# Altium footprint library 22-Transformer.PcbLib: 68 footprints (part 1 of 5)
Each footprint in its own frame and in the unit in brackets; x right, y up, seen from the top. Pads: shape width x height; smd on the part's side, far side on the other; paste and mask are expansions set on the pad; w line width, h text height; cw(c..) or ccw(c..) is an arc to the next point about the centre after c.
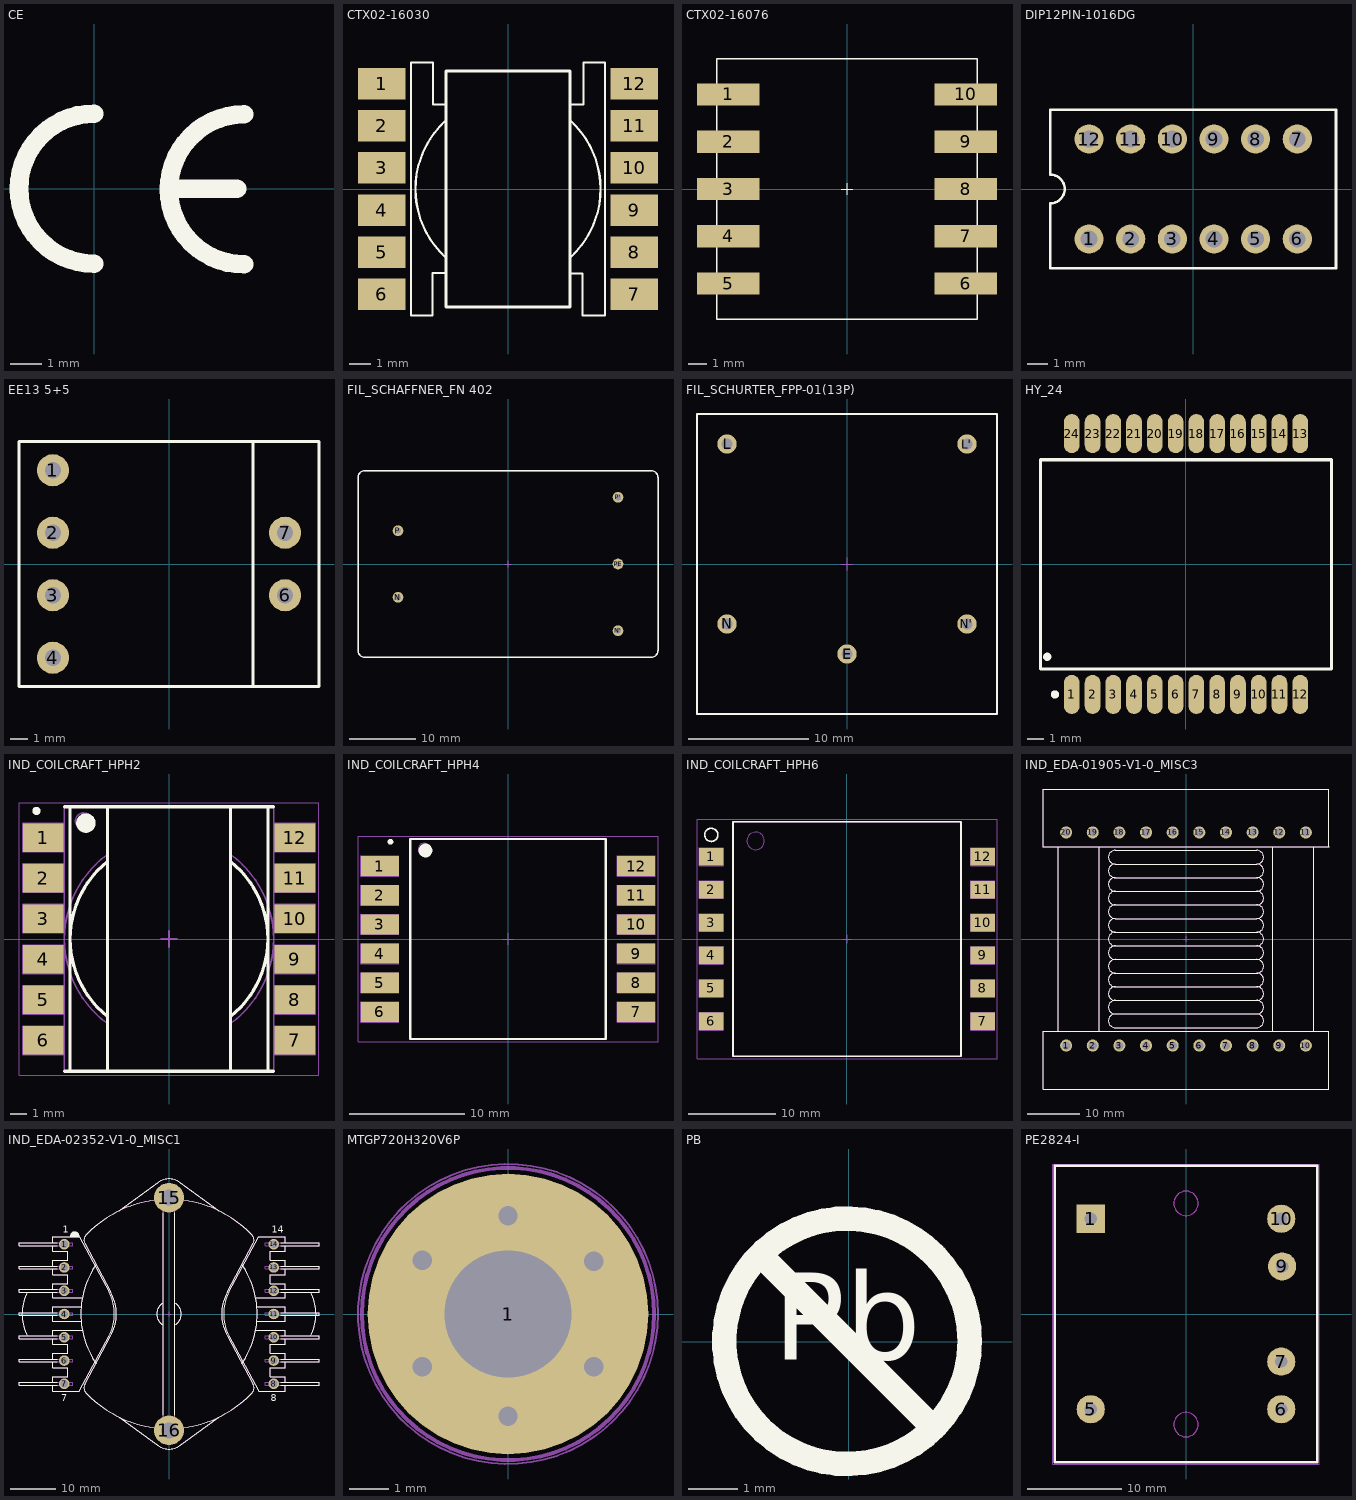
[diagram p0: the footprints below, top view; thin cyan lines are the x and y axes]

## CE [mm]
Top Overlay:
  lines w0.6: 0,-2.413 cw(c0,0) 0,2.413 ; 2.53,0 4.6,0 ; 4.826,-2.438 cw(c4.826,-0.025) 4.826,2.388
3D body "ce.stp": height 0.02, standoff 0, extent -2.725,-2.725 4.82,2.725

## CTX02-16030 [mm]
height 38.1
pads (12):
  rect 2.25x1.5 smd mask+0.07: 1(-6,5) 2(-6,3) 3(-6,1) 4(-6,-1) 5(-6,-3) 6(-6,-5) 7(6,-5) 8(6,-3) 9(6,-1) 10(6,1) 11(6,3)
  rect 2.25x1.5 smd: 12(6,5)
Top Overlay:
  lines w0.1: -4.6,5.994 -4.6,-6 -3.594,-6 ; -4.6,6 -3.569,6 -3.569,4.013 -2.972,4.013 ; -3.594,-5.982 -3.594,-3.995 -2.997,-3.995 ; -2.998,3.215 ccw(c0,0) -2.973,-3.238 ; 2.946,-4.013 3.543,-4.013 3.543,-6 4.6,-6 4.6,5.969 ; 2.973,3.238 cw(c0,0) 2.998,-3.215 ; 2.984,4.013 3.581,4.013 3.581,6 4.6,6
  lines w0.15: -2.95,-5.6 2.95,-5.6 2.95,5.6 -2.95,5.6 -2.95,-5.6

## CTX02-16076 [mm]
height 38.1
pads (10):
  rect 3.36x1.2 smd mask+0.07: 1(-6.38,5.08) 2(-6.38,2.54) 3(-6.38,0) 4(-6.38,-2.54) 5(-6.38,-5.08) 6(6.38,-5.08) 7(6.38,-2.54) 8(6.38,0) 9(6.38,2.54)
  rect 3.36x1.2 smd: 10(6.38,5.08)
Top Overlay:
  lines w0.025: -0.318,0 0.318,0 ; 0,-0.318 0,0.318
  lines w0.1: -7,-7 -7,7 7,7 7,-7 -7,-7
3D body "ctx-02-16076.stp": height 10.51, standoff 0, extent -7.739,-7.049 7.84,7.051
3D body "ctx02-16076.stp": height 0.02, standoff 0, extent 4.717,4.477 8.077,5.677
3D body "ctx02-16076.stp": height 0.02, standoff 0, extent 4.705,1.95 8.064,3.15
3D body "ctx02-16076.stp": height 0.02, standoff 0, extent 4.717,-0.616 8.077,0.584
3D body "ctx02-16076.stp": height 0.02, standoff 0, extent 4.705,-3.156 8.064,-1.956
3D body "ctx02-16076.stp": height 0.02, standoff 0, extent 4.705,-5.696 8.064,-4.496
3D body "ctx02-16076.stp": height 0.02, standoff 0, extent -8.077,4.49 -4.717,5.69
3D body "ctx02-16076.stp": height 0.02, standoff 0, extent -8.064,1.937 -4.705,3.137
3D body "ctx02-16076.stp": height 0.02, standoff 0, extent -8.064,-0.603 -4.705,0.597
3D body "ctx02-16076.stp": height 0.02, standoff 0, extent -8.064,-3.143 -4.705,-1.943
3D body "ctx02-16076.stp": height 0.02, standoff 0, extent -8.064,-5.683 -4.705,-4.483

## DIP12PIN-1016DG [mm]
height 38.1
pads (12):
  round 1.4 hole 0.8: 1(-5,-2.4) 2(-3,-2.4) 3(-1,-2.4) 4(1,-2.4) 5(3,-2.4) 6(5,-2.4) 7(5,2.4) 8(3,2.4) 9(1,2.4) 10(-1,2.4) 11(-3,2.4) 12(-5,2.4)
Top Overlay:
  lines w0.127: -6.858,-0.762 -6.858,-3.81 6.858,-3.81 6.858,3.81 -6.858,3.81 -6.858,0.688 cw(c-6.858,0) -6.858,-0.688
3D body "tf-1016dg.stp": height 5.86, standoff -2.35, extent -6.725,-3.7 6.725,3.7

## EE13 5+5 [mm]
height 38.1
pads (6):
  round 1.8 hole 0.9: 1(-6.5,5.25) 2(-6.5,1.75) 3(-6.5,-1.75) 4(-6.5,-5.25) 6(6.5,-1.75) 7(6.5,1.75)
Top Overlay:
  lines w0.15: 4.706,-6.858 4.706,6.858 ; -8.4,-6.858 8.4,-6.858 8.4,6.858 -8.4,6.858 -8.4,-6.858
3D body "ee13-4x4.stp": height 14, standoff -3.4, extent -8.4,-6.83 8.4,6.885

## FIL_SCHAFFNER_FN 402 [mm] "0.6 to 6.5A 250VAC Single Phase Low Cost PCB Filter (Body 45 x 28x 16.5mm)"
height 16.5
pads (5):
  round 1.6 hole 0.9: N(-16.5,-5) N'(16.5,-10) P(-16.5,5) P'(16.5,10) PE(16.5,0)
Top Overlay:
  lines w0.2: -22.5,-13 ccw(c-21.5,-13) -21.5,-14 21.5,-14 ccw(c21.5,-13) 22.5,-13 22.5,13 ccw(c21.5,13) 21.5,14 -21.5,14 ccw(c-21.5,13) -22.5,13 -22.5,-13
Mechanical 8:
  lines w0.1: -17,-5 -16.5,-5 ; -17,5 -16.5,5 ; -16.5,-5.5 -16.5,-5 ; -16.5,-4.5 -16.5,-5 ; -16.5,4.5 -16.5,5 ; -16.5,5.5 -16.5,5 ; -16,-5 -16.5,-5 ; -16,5 -16.5,5 ; -0.5,0 0,0 ; 0,-0.5 0,0 ; 0,0.5 0,0 ; 0.5,0 0,0 ; 16,-10 16.5,-10 ; 16,0 16.5,0 ; 16,10 16.5,10 ; 16.5,-10.5 16.5,-10 ; 16.5,-9.5 16.5,-10 ; 16.5,-0.5 16.5,0 ; 16.5,0.5 16.5,0 ; 16.5,9.5 16.5,10 ; 16.5,10.5 16.5,10 ; 17,-10 16.5,-10 ; 17,0 16.5,0 ; 17,10 16.5,10
Mechanical 14:
  lines w0.1: -20.5,14 -21.5,14 ; -21.5,14 ccw(c-21.5,13) -22.5,13 -22.5,-13 ccw(c-21.5,-13) -21.5,-14 21.5,-14 ccw(c21.5,-13) 22.5,-13 22.5,13 ccw(c21.5,13) 21.5,14 -21.5,14
3D body "FIL_SCHAFFNER_FN 402.stp": height 16.5, standoff -3.6, extent -22.5,-14 22.5,14

## FIL_SCHURTER_FPP-01(13P) [mm] "Single Phase Line Block Filter FPP-01 Serie, Case 13P"
height 25
pads (5):
  round 1.6 hole 0.9: E(0,-7.5) L(-10,10) L'(10,10) N(-10,-5) N'(10,-5)
Top Overlay:
  lines w0.2: -12.5,-12.5 -12.5,12.5 12.5,12.5 12.5,-12.5 -12.5,-12.5
Mechanical 8:
  lines w0.1: -10.5,-5 -10,-5 ; -10.5,10 -10,10 ; -10,-5.5 -10,-5 ; -10,-4.5 -10,-5 ; -10,9.5 -10,10 ; -10,10.5 -10,10 ; -9.5,-5 -10,-5 ; -9.5,10 -10,10 ; -0.5,-7.5 0,-7.5 ; -0.5,0 0,0 ; 0,-8 0,-7.5 ; 0,-7 0,-7.5 ; 0,-0.5 0,0 ; 0,0.5 0,0 ; 0.5,-7.5 0,-7.5 ; 0.5,0 0,0 ; 9.5,-5 10,-5 ; 9.5,10 10,10 ; 10,-5.5 10,-5 ; 10,-4.5 10,-5 ; 10,9.5 10,10 ; 10,10.5 10,10 ; 10.5,-5 10,-5 ; 10.5,10 10,10
Mechanical 14:
  lines w0.1: -12.5,-12.5 -12.5,12.5 12.5,12.5 12.5,-12.5 -12.5,-12.5
3D body "IND_SCHURTER_CASE 13P.stp": height 25, standoff -3.8, extent -12.5,-12.5 12.5,12.5

## HY_24 [mm]
height 38.1
pads (24):
  oval 0.96x2.4 smd mask+0.07: 1(-6.985,-7.975) 3(-4.445,-7.975) 4(-3.175,-7.975) 5(-1.905,-7.975) 6(-0.635,-7.975) 7(0.635,-7.975) 8(1.905,-7.975) 9(3.175,-7.975) 10(4.445,-7.975) 11(5.715,-7.975) 12(6.985,-7.975) 13(6.985,7.975) 14(5.715,7.975) 15(4.445,7.975) 16(3.175,7.975) 17(1.905,7.975) 18(0.635,7.975) 19(-0.635,7.975) 20(-1.905,7.975) 21(-3.175,7.975) 22(-4.445,7.975) 23(-5.715,7.975) 24(-6.985,7.975)
  oval 0.96x2.4 smd: 2(-5.715,-7.975)
Top Overlay:
  circle w0.25: c-8.49,-5.675 r0.125
  circle w0.25: c-8.015,-7.975 r0.125
  lines w0.2: -8.9,-6.425 8.9,-6.425 8.9,6.375 -8.9,6.375 -8.9,-6.425
3D body "0_95-2_44.stp": height 0.02, standoff 0, extent 6.505,-9.175 7.465,-6.775
3D body "0_95-2_44.stp": height 0.02, standoff 0, extent 5.235,-9.175 6.195,-6.775
3D body "0_95-2_44.stp": height 0.02, standoff 0, extent 3.965,-9.175 4.925,-6.775
3D body "0_95-2_44.stp": height 0.02, standoff 0, extent 2.695,-9.175 3.655,-6.775
3D body "0_95-2_44.stp": height 0.02, standoff 0, extent 1.425,-9.175 2.385,-6.775
3D body "0_95-2_44.stp": height 0.02, standoff 0, extent 0.155,-9.175 1.115,-6.775
3D body "0_95-2_44.stp": height 0.02, standoff 0, extent -1.115,-9.175 -0.155,-6.775
3D body "0_95-2_44.stp": height 0.02, standoff 0, extent -2.385,-9.175 -1.425,-6.775
3D body "0_95-2_44.stp": height 0.02, standoff 0, extent -3.655,-9.175 -2.695,-6.775
3D body "0_95-2_44.stp": height 0.02, standoff 0, extent -4.925,-9.175 -3.965,-6.775
3D body "0_95-2_44.stp": height 0.02, standoff 0, extent -6.195,-9.175 -5.235,-6.775
3D body "0_95-2_44.stp": height 0.02, standoff 0, extent -7.465,-9.175 -6.505,-6.775
3D body "0_95-2_44.stp": height 0.02, standoff 0, extent 6.505,6.775 7.465,9.175
3D body "0_95-2_44.stp": height 0.02, standoff 0, extent 5.235,6.775 6.195,9.175
3D body "0_95-2_44.stp": height 0.02, standoff 0, extent 3.965,6.775 4.925,9.175
3D body "0_95-2_44.stp": height 0.02, standoff 0, extent 2.695,6.775 3.655,9.175
3D body "0_95-2_44.stp": height 0.02, standoff 0, extent 1.425,6.775 2.385,9.175
3D body "0_95-2_44.stp": height 0.02, standoff 0, extent 0.155,6.775 1.115,9.175
3D body "0_95-2_44.stp": height 0.02, standoff 0, extent -1.115,6.775 -0.155,9.175
3D body "0_95-2_44.stp": height 0.02, standoff 0, extent -2.385,6.775 -1.425,9.175
3D body "0_95-2_44.stp": height 0.02, standoff 0, extent -3.655,6.775 -2.695,9.175
3D body "0_95-2_44.stp": height 0.02, standoff 0, extent -4.925,6.775 -3.965,9.175
3D body "0_95-2_44.stp": height 0.02, standoff 0, extent -6.195,6.775 -5.235,9.175
3D body "0_95-2_44.stp": height 0.02, standoff 0, extent -7.465,6.775 -6.505,9.175
3D body "hy682405.stp": height 3.25, standoff 0, extent -8.9,-7.92 8.9,7.92

## IND_COILCRAFT_HPH2 [mm] "Hexa-Path Magnetics, Six 1:1 Isolated Windings, HPH2 Case"
height 7.4
pads (12):
  rect 2.5x1.75 smd: 1(-7.75,6.25) 2(-7.75,3.75) 3(-7.75,1.25) 4(-7.75,-1.25) 5(-7.75,-3.75) 6(-7.75,-6.25) 7(7.75,-6.25) 8(7.75,-3.75) 9(7.75,-1.25) 10(7.75,1.25) 11(7.75,3.75) 12(7.75,6.25)
Top Overlay:
  circle w0.6: c-5.125,7.15 r0.3
  circle w0.25: c-8.175,7.9 r0.125
  lines w0.2: -6.45,-8.15 6.45,-8.15 ; -6.45,8.15 6.45,8.15 ; -6.1,-8.15 -6.1,8.15 ; -3.8,-8.15 -3.8,8.15 ; -3.8,-4.772 cw(c0,0) -3.8,4.772 ; 3.8,-8.15 3.8,8.15 ; 3.8,-4.772 ccw(c0,0) 3.8,4.772 ; 6.1,-8.15 6.1,8.15
Mechanical 8:
  lines w0.1: -8.25,-6.25 -7.75,-6.25 ; -8.25,-3.75 -7.75,-3.75 ; -8.25,-1.25 -7.75,-1.25 ; -8.25,1.25 -7.75,1.25 ; -8.25,3.75 -7.75,3.75 ; -8.25,6.25 -7.75,6.25 ; -7.75,-6.75 -7.75,-6.25 ; -7.75,-5.75 -7.75,-6.25 ; -7.75,-4.25 -7.75,-3.75 ; -7.75,-3.25 -7.75,-3.75 ; -7.75,-1.75 -7.75,-1.25 ; -7.75,-0.75 -7.75,-1.25 ; -7.75,0.75 -7.75,1.25 ; -7.75,1.75 -7.75,1.25 ; -7.75,3.25 -7.75,3.75 ; -7.75,4.25 -7.75,3.75 ; -7.75,5.75 -7.75,6.25 ; -7.75,6.75 -7.75,6.25 ; -7.25,-6.25 -7.75,-6.25 ; -7.25,-3.75 -7.75,-3.75 ; -7.25,-1.25 -7.75,-1.25 ; -7.25,1.25 -7.75,1.25 ; -7.25,3.75 -7.75,3.75 ; -7.25,6.25 -7.75,6.25 ; -0.5,0 0,0 ; 0,-0.5 0,0 ; 0,0.5 0,0 ; 0.5,0 0,0 ; 7.25,-6.25 7.75,-6.25 ; 7.25,-3.75 7.75,-3.75 ; 7.25,-1.25 7.75,-1.25 ; 7.25,1.25 7.75,1.25 ; 7.25,3.75 7.75,3.75 ; 7.25,6.25 7.75,6.25 ; 7.75,-6.75 7.75,-6.25 ; 7.75,-5.75 7.75,-6.25 ; 7.75,-4.25 7.75,-3.75 ; 7.75,-3.25 7.75,-3.75 ; 7.75,-1.75 7.75,-1.25 ; 7.75,-0.75 7.75,-1.25 ; 7.75,0.75 7.75,1.25 ; 7.75,1.75 7.75,1.25 ; 7.75,3.25 7.75,3.75 ; 7.75,4.25 7.75,3.75 ; 7.75,5.75 7.75,6.25 ; 7.75,6.75 7.75,6.25 ; 8.25,-6.25 7.75,-6.25 ; 8.25,-3.75 7.75,-3.75 ; 8.25,-1.25 7.75,-1.25 ; 8.25,1.25 7.75,1.25 ; 8.25,3.75 7.75,3.75 ; 8.25,6.25 7.75,6.25 ; -9,-7.125 -6.5,-7.125 -6.5,-5.375 -9,-5.375 -9,-7.125 ; -9,-4.625 -6.5,-4.625 -6.5,-2.875 -9,-2.875 -9,-4.625 ; -9,-2.125 -6.5,-2.125 -6.5,-0.375 -9,-0.375 -9,-2.125 ; -9,0.375 -6.5,0.375 -6.5,2.125 -9,2.125 -9,0.375 ; -9,2.875 -6.5,2.875 -6.5,4.625 -9,4.625 -9,2.875 ; -9,5.375 -6.5,5.375 -6.5,7.125 -9,7.125 -9,5.375 ; 6.5,-7.125 9,-7.125 9,-5.375 6.5,-5.375 6.5,-7.125 ; 6.5,-4.625 9,-4.625 9,-2.875 6.5,-2.875 6.5,-4.625 ; 6.5,-2.125 9,-2.125 9,-0.375 6.5,-0.375 6.5,-2.125 ; 6.5,0.375 9,0.375 9,2.125 6.5,2.125 6.5,0.375 ; 6.5,2.875 9,2.875 9,4.625 6.5,4.625 6.5,2.875 ; 6.5,5.375 9,5.375 9,7.125 6.5,7.125 6.5,5.375
Mechanical 14:
  circle w0.1: c-5.275,7.275 r0.5
  lines w0.1: -3.8,-8.15 -3.8,8.15 ; -3.8,-5.212 cw(c0,0) -3.8,5.212 ; 3.8,-8.15 3.8,8.15 ; 3.8,-5.212 ccw(c0,0) 3.8,5.212 ; -6.45,-8.15 -6.45,8.15 6.45,8.15 6.45,-8.15 -6.45,-8.15
Mechanical 15:
  lines w0.05: -9.25,-8.4 -9.25,8.4 9.25,8.4 9.25,-8.4 -9.25,-8.4
3D body "IND_COILCRAFT_HPH2.stp": height 7.4, standoff 0.01, extent -8.4,-8.15 8.4,8.15

## IND_COILCRAFT_HPH4 [mm] "Hexa-Path Magnetics, Two Trifilar Windings, HPH4 Case"
height 9.7
pads (12):
  rect 3.3x1.75 smd: 1(-11.15,6.35) 2(-11.15,3.81) 3(-11.15,1.27) 4(-11.15,-1.27) 5(-11.15,-3.81) 6(-11.15,-6.35) 7(11.15,-6.35) 8(11.15,-3.81) 9(11.15,-1.27) 10(11.15,1.27) 11(11.15,3.81) 12(11.15,6.35)
Top Overlay:
  circle w0.25: c-10.225,8.45 r0.125
  circle w0.6: c-7.175,7.7 r0.3
  lines w0.2: -8.5,-8.7 8.5,-8.7 8.5,8.7 -8.5,8.7 -8.5,-8.7
Mechanical 8:
  lines w0.1: -11.65,-6.35 -11.15,-6.35 ; -11.65,-3.81 -11.15,-3.81 ; -11.65,-1.27 -11.15,-1.27 ; -11.65,1.27 -11.15,1.27 ; -11.65,3.81 -11.15,3.81 ; -11.65,6.35 -11.15,6.35 ; -11.15,-6.85 -11.15,-6.35 ; -11.15,-5.85 -11.15,-6.35 ; -11.15,-4.31 -11.15,-3.81 ; -11.15,-3.31 -11.15,-3.81 ; -11.15,-1.77 -11.15,-1.27 ; -11.15,-0.77 -11.15,-1.27 ; -11.15,0.77 -11.15,1.27 ; -11.15,1.77 -11.15,1.27 ; -11.15,3.31 -11.15,3.81 ; -11.15,4.31 -11.15,3.81 ; -11.15,5.85 -11.15,6.35 ; -11.15,6.85 -11.15,6.35 ; -10.65,-6.35 -11.15,-6.35 ; -10.65,-3.81 -11.15,-3.81 ; -10.65,-1.27 -11.15,-1.27 ; -10.65,1.27 -11.15,1.27 ; -10.65,3.81 -11.15,3.81 ; -10.65,6.35 -11.15,6.35 ; -0.5,0 0,0 ; 0,-0.5 0,0 ; 0,0.5 0,0 ; 0.5,0 0,0 ; 10.65,-6.35 11.15,-6.35 ; 10.65,-3.81 11.15,-3.81 ; 10.65,-1.27 11.15,-1.27 ; 10.65,1.27 11.15,1.27 ; 10.65,3.81 11.15,3.81 ; 10.65,6.35 11.15,6.35 ; 11.15,-6.85 11.15,-6.35 ; 11.15,-5.85 11.15,-6.35 ; 11.15,-4.31 11.15,-3.81 ; 11.15,-3.31 11.15,-3.81 ; 11.15,-1.77 11.15,-1.27 ; 11.15,-0.77 11.15,-1.27 ; 11.15,0.77 11.15,1.27 ; 11.15,1.77 11.15,1.27 ; 11.15,3.31 11.15,3.81 ; 11.15,4.31 11.15,3.81 ; 11.15,5.85 11.15,6.35 ; 11.15,6.85 11.15,6.35 ; 11.65,-6.35 11.15,-6.35 ; 11.65,-3.81 11.15,-3.81 ; 11.65,-1.27 11.15,-1.27 ; 11.65,1.27 11.15,1.27 ; 11.65,3.81 11.15,3.81 ; 11.65,6.35 11.15,6.35 ; -12.8,-7.225 -12.8,-5.475 -9.5,-5.475 -9.5,-7.225 -12.8,-7.225 ; -12.8,-4.685 -12.8,-2.935 -9.5,-2.935 -9.5,-4.685 -12.8,-4.685 ; -12.8,-2.145 -12.8,-0.395 -9.5,-0.395 -9.5,-2.145 -12.8,-2.145 ; -12.8,0.395 -12.8,2.145 -9.5,2.145 -9.5,0.395 -12.8,0.395 ; -12.8,2.935 -12.8,4.685 -9.5,4.685 -9.5,2.935 -12.8,2.935 ; -12.8,5.475 -12.8,7.225 -9.5,7.225 -9.5,5.475 -12.8,5.475 ; 9.5,-7.225 9.5,-5.475 12.8,-5.475 12.8,-7.225 9.5,-7.225 ; 9.5,-4.685 9.5,-2.935 12.8,-2.935 12.8,-4.685 9.5,-4.685 ; 9.5,-2.145 9.5,-0.395 12.8,-0.395 12.8,-2.145 9.5,-2.145 ; 9.5,0.395 9.5,2.145 12.8,2.145 12.8,0.395 9.5,0.395 ; 9.5,2.935 9.5,4.685 12.8,4.685 12.8,2.935 9.5,2.935 ; 9.5,5.475 9.5,7.225 12.8,7.225 12.8,5.475 9.5,5.475
Mechanical 14:
  circle w0.1: c-7.325,7.825 r0.5
  lines w0.1: -8.5,-8.7 8.5,-8.7 8.5,8.7 -8.5,8.7 -8.5,-8.7
Mechanical 15:
  lines w0.05: -13.05,-8.95 13.05,-8.95 13.05,8.95 -13.05,8.95 -13.05,-8.95
3D body "IND_COILCRAFT_HPH4.stp": height 9.7, standoff 0, extent -12.065,-8.7 12.065,8.7

## IND_COILCRAFT_HPH6 [mm] "Hexa-Path Magnetics, Two Trifilar Windings, HPH6 Case"
height 13.6
pads (12):
  rect 2.75x2 smd: 1(-15.475,9.375) 2(-15.475,5.625) 3(-15.475,1.875) 4(-15.475,-1.875) 5(-15.475,-5.625) 6(-15.475,-9.375) 7(15.475,-9.375) 8(15.475,-5.625) 9(15.475,-1.875) 10(15.475,1.875) 11(15.475,5.625) 12(15.475,9.375)
Top Overlay:
  circle w0.2: c-15.475,11.875 r0.75
  lines w0.2: -13,-13.375 -13,13.375 13,13.375 13,-13.375 -13,-13.375
Mechanical 8:
  lines w0.1: -15.975,-9.375 -15.475,-9.375 ; -15.975,-5.625 -15.475,-5.625 ; -15.975,-1.875 -15.475,-1.875 ; -15.975,1.875 -15.475,1.875 ; -15.975,5.625 -15.475,5.625 ; -15.975,9.375 -15.475,9.375 ; -15.475,-9.875 -15.475,-9.375 ; -15.475,-8.875 -15.475,-9.375 ; -15.475,-6.125 -15.475,-5.625 ; -15.475,-5.125 -15.475,-5.625 ; -15.475,-2.375 -15.475,-1.875 ; -15.475,-1.375 -15.475,-1.875 ; -15.475,1.375 -15.475,1.875 ; -15.475,2.375 -15.475,1.875 ; -15.475,5.125 -15.475,5.625 ; -15.475,6.125 -15.475,5.625 ; -15.475,8.875 -15.475,9.375 ; -15.475,9.875 -15.475,9.375 ; -14.975,-9.375 -15.475,-9.375 ; -14.975,-5.625 -15.475,-5.625 ; -14.975,-1.875 -15.475,-1.875 ; -14.975,1.875 -15.475,1.875 ; -14.975,5.625 -15.475,5.625 ; -14.975,9.375 -15.475,9.375 ; -0.5,0 0,0 ; 0,-0.5 0,0 ; 0,0.5 0,0 ; 0.5,0 0,0 ; 14.975,-9.375 15.475,-9.375 ; 14.975,-5.625 15.475,-5.625 ; 14.975,-1.875 15.475,-1.875 ; 14.975,1.875 15.475,1.875 ; 14.975,5.625 15.475,5.625 ; 14.975,9.375 15.475,9.375 ; 15.475,-9.875 15.475,-9.375 ; 15.475,-8.875 15.475,-9.375 ; 15.475,-6.125 15.475,-5.625 ; 15.475,-5.125 15.475,-5.625 ; 15.475,-2.375 15.475,-1.875 ; 15.475,-1.375 15.475,-1.875 ; 15.475,1.375 15.475,1.875 ; 15.475,2.375 15.475,1.875 ; 15.475,5.125 15.475,5.625 ; 15.475,6.125 15.475,5.625 ; 15.475,8.875 15.475,9.375 ; 15.475,9.875 15.475,9.375 ; 15.975,-9.375 15.475,-9.375 ; 15.975,-5.625 15.475,-5.625 ; 15.975,-1.875 15.475,-1.875 ; 15.975,1.875 15.475,1.875 ; 15.975,5.625 15.475,5.625 ; 15.975,9.375 15.475,9.375 ; -16.85,-10.375 -14.1,-10.375 -14.1,-8.375 -16.85,-8.375 -16.85,-10.375 ; -16.85,-6.625 -14.1,-6.625 -14.1,-4.625 -16.85,-4.625 -16.85,-6.625 ; -16.85,-2.875 -14.1,-2.875 -14.1,-0.875 -16.85,-0.875 -16.85,-2.875 ; -16.85,0.875 -14.1,0.875 -14.1,2.875 -16.85,2.875 -16.85,0.875 ; -16.85,4.625 -14.1,4.625 -14.1,6.625 -16.85,6.625 -16.85,4.625 ; -16.85,8.375 -14.1,8.375 -14.1,10.375 -16.85,10.375 -16.85,8.375 ; 14.1,-10.375 16.85,-10.375 16.85,-8.375 14.1,-8.375 14.1,-10.375 ; 14.1,-6.625 16.85,-6.625 16.85,-4.625 14.1,-4.625 14.1,-6.625 ; 14.1,-2.875 16.85,-2.875 16.85,-0.875 14.1,-0.875 14.1,-2.875 ; 14.1,0.875 16.85,0.875 16.85,2.875 14.1,2.875 14.1,0.875 ; 14.1,4.625 16.85,4.625 16.85,6.625 14.1,6.625 14.1,4.625 ; 14.1,8.375 16.85,8.375 16.85,10.375 14.1,10.375 14.1,8.375
Mechanical 14:
  circle w0.1: c-10.409,11.181 r1
  lines w0.1: -13,-13.375 -13,13.375 13,13.375 13,-13.375 -13,-13.375
Mechanical 15:
  lines w0.05: -17.1,-13.625 17.1,-13.625 17.1,13.625 -17.1,13.625 -17.1,-13.625
3D body "IND_COILCRAFT_HPH6.stp": height 13.6, standoff 0, extent -16.325,-13.375 16.325,13.375

## IND_EDA-01905-V1-0_MISC3 [mm] "see EDA-01905-V1-0_misc3"
height 40.6
pads (20):
  round 2.3 hole 1.6: 1(-22.86,-20.32) 2(-17.78,-20.32) 3(-12.7,-20.32) 4(-7.62,-20.32) 5(-2.54,-20.32) 6(2.54,-20.32) 7(7.62,-20.32) 8(12.7,-20.32) 9(17.78,-20.32) 10(22.86,-20.32) 11(22.86,20.32) 12(17.78,20.32) 13(12.7,20.32) 14(7.62,20.32) 15(2.54,20.32) 16(-2.54,20.32) 17(-7.62,20.32) 18(-12.7,20.32) 19(-17.78,20.32) 20(-22.86,20.32)
Top Overlay:
  lines w0.2: -27.35,17.6 27.35,17.6 ; -27.25,17.6 -27.25,28.6 27.25,28.6 27.25,17.6 ; -24.35,-17.6 -24.35,17.6 ; -16.583,-17.6 -16.583,17.6 ; 16.583,-17.6 16.583,17.6 ; 24.35,-17.6 24.35,17.6 ; -13.5,-14.3 cw(c-13.5,-13) -13.5,-11.7 ; -13.5,-14.3 ccw(c-13.5,-15.6) -13.5,-16.9 13.5,-16.9 ccw(c13.5,-15.6) 13.5,-14.3 ; -13.5,-14.3 13.5,-14.3 ; -13.5,-11.7 cw(c-13.5,-10.4) -13.5,-9.1 ; -13.5,-11.7 13.5,-11.7 ; -13.5,-9.1 cw(c-13.5,-7.8) -13.5,-6.5 ; -13.5,-9.1 13.5,-9.1 ; -13.5,-6.5 cw(c-13.5,-5.2) -13.5,-3.9 ; -13.5,-6.5 13.5,-6.5 ; -13.5,-3.9 cw(c-13.5,-2.6) -13.5,-1.3 ; -13.5,-3.9 13.5,-3.9 ; -13.5,-1.3 cw(c-13.5,0) -13.5,1.3 ; -13.5,-1.3 13.5,-1.3 ; -13.5,1.3 cw(c-13.5,2.6) -13.5,3.9 ; -13.5,1.3 13.5,1.3 ; -13.5,3.9 cw(c-13.5,5.2) -13.5,6.5 ; -13.5,3.9 13.5,3.9 ; -13.5,6.5 cw(c-13.5,7.8) -13.5,9.1 ; -13.5,6.5 13.5,6.5 ; -13.5,9.1 cw(c-13.5,10.4) -13.5,11.7 ; -13.5,9.1 13.5,9.1 ; -13.5,11.7 cw(c-13.5,13) -13.5,14.3 ; -13.5,11.7 13.5,11.7 ; -13.5,14.3 cw(c-13.5,15.6) -13.5,16.9 13.5,16.9 cw(c13.5,15.6) 13.5,14.3 ; -13.5,14.3 13.5,14.3 ; -13.5,14.3 13.5,14.3 ; 13.5,-14.3 ccw(c13.5,-13) 13.5,-11.7 ; 13.5,-11.7 ccw(c13.5,-10.4) 13.5,-9.1 ; 13.5,-9.1 ccw(c13.5,-7.8) 13.5,-6.5 ; 13.5,-6.5 ccw(c13.5,-5.2) 13.5,-3.9 ; 13.5,-3.9 ccw(c13.5,-2.6) 13.5,-1.3 ; 13.5,-1.3 ccw(c13.5,0) 13.5,1.3 ; 13.5,1.3 ccw(c13.5,2.6) 13.5,3.9 ; 13.5,3.9 ccw(c13.5,5.2) 13.5,6.5 ; 13.5,6.5 ccw(c13.5,7.8) 13.5,9.1 ; 13.5,9.1 ccw(c13.5,10.4) 13.5,11.7 ; 13.5,11.7 ccw(c13.5,13) 13.5,14.3 ; -27.25,-28.6 -27.25,-17.6 27.25,-17.6 27.25,-28.6 -27.25,-28.6
Mechanical 8:
  lines w0.1: -23.36,-20.32 -22.86,-20.32 ; -23.36,20.32 -22.86,20.32 ; -22.86,-20.82 -22.86,-20.32 ; -22.86,-19.82 -22.86,-20.32 ; -22.86,19.82 -22.86,20.32 ; -22.86,20.82 -22.86,20.32 ; -22.36,-20.32 -22.86,-20.32 ; -22.36,20.32 -22.86,20.32 ; -18.28,-20.32 -17.78,-20.32 ; -18.28,20.32 -17.78,20.32 ; -17.78,-20.82 -17.78,-20.32 ; -17.78,-19.82 -17.78,-20.32 ; -17.78,19.82 -17.78,20.32 ; -17.78,20.82 -17.78,20.32 ; -17.28,-20.32 -17.78,-20.32 ; -17.28,20.32 -17.78,20.32 ; -13.2,-20.32 -12.7,-20.32 ; -13.2,20.32 -12.7,20.32 ; -12.7,-20.82 -12.7,-20.32 ; -12.7,-19.82 -12.7,-20.32 ; -12.7,19.82 -12.7,20.32 ; -12.7,20.82 -12.7,20.32 ; -12.2,-20.32 -12.7,-20.32 ; -12.2,20.32 -12.7,20.32 ; -8.12,-20.32 -7.62,-20.32 ; -8.12,20.32 -7.62,20.32 ; -7.62,-20.82 -7.62,-20.32 ; -7.62,-19.82 -7.62,-20.32 ; -7.62,19.82 -7.62,20.32 ; -7.62,20.82 -7.62,20.32 ; -7.12,-20.32 -7.62,-20.32 ; -7.12,20.32 -7.62,20.32 ; -3.04,-20.32 -2.54,-20.32 ; -3.04,20.32 -2.54,20.32 ; -2.54,-20.82 -2.54,-20.32 ; -2.54,-19.82 -2.54,-20.32 ; -2.54,19.82 -2.54,20.32 ; -2.54,20.82 -2.54,20.32 ; -2.04,-20.32 -2.54,-20.32 ; -2.04,20.32 -2.54,20.32 ; -0.5,0 0,0 ; 0,-0.5 0,0 ; 0,0.5 0,0 ; 0.5,0 0,0 ; 2.04,-20.32 2.54,-20.32 ; 2.04,20.32 2.54,20.32 ; 2.54,-20.82 2.54,-20.32 ; 2.54,-19.82 2.54,-20.32 ; 2.54,19.82 2.54,20.32 ; 2.54,20.82 2.54,20.32 ; 3.04,-20.32 2.54,-20.32 ; 3.04,20.32 2.54,20.32 ; 7.12,-20.32 7.62,-20.32 ; 7.12,20.32 7.62,20.32 ; 7.62,-20.82 7.62,-20.32 ; 7.62,-19.82 7.62,-20.32 ; 7.62,19.82 7.62,20.32 ; 7.62,20.82 7.62,20.32 ; 8.12,-20.32 7.62,-20.32 ; 8.12,20.32 7.62,20.32 ; 12.2,-20.32 12.7,-20.32 ; 12.2,20.32 12.7,20.32 ; 12.7,-20.82 12.7,-20.32 ; 12.7,-19.82 12.7,-20.32 ; 12.7,19.82 12.7,20.32 ; 12.7,20.82 12.7,20.32 ; 13.2,-20.32 12.7,-20.32 ; 13.2,20.32 12.7,20.32 ; 17.28,-20.32 17.78,-20.32 ; 17.28,20.32 17.78,20.32 ; 17.78,-20.82 17.78,-20.32 ; 17.78,-19.82 17.78,-20.32 ; 17.78,19.82 17.78,20.32 ; 17.78,20.82 17.78,20.32 ; 18.28,-20.32 17.78,-20.32 ; 18.28,20.32 17.78,20.32 ; 22.36,-20.32 22.86,-20.32 ; 22.36,20.32 22.86,20.32 ; 22.86,-20.82 22.86,-20.32 ; 22.86,-19.82 22.86,-20.32 ; 22.86,19.82 22.86,20.32 ; 22.86,20.82 22.86,20.32 ; 23.36,-20.32 22.86,-20.32 ; 23.36,20.32 22.86,20.32
Mechanical 14:
  lines w0.1: -27.35,17.6 27.35,17.6 ; -27.25,17.6 -27.25,28.6 27.25,28.6 27.25,17.6 ; -24.35,-17.6 -24.35,17.6 ; -16.583,-17.6 -16.583,17.6 ; 16.583,-17.6 16.583,17.6 ; 24.35,-17.6 24.35,17.6 ; -13.5,-14.3 cw(c-13.5,-13) -13.5,-11.7 ; -13.5,-14.3 ccw(c-13.5,-15.6) -13.5,-16.9 13.5,-16.9 ccw(c13.5,-15.6) 13.5,-14.3 ; -13.5,-14.3 13.5,-14.3 ; -13.5,-11.7 cw(c-13.5,-10.4) -13.5,-9.1 ; -13.5,-11.7 13.5,-11.7 ; -13.5,-9.1 cw(c-13.5,-7.8) -13.5,-6.5 ; -13.5,-9.1 13.5,-9.1 ; -13.5,-6.5 cw(c-13.5,-5.2) -13.5,-3.9 ; -13.5,-6.5 13.5,-6.5 ; -13.5,-3.9 cw(c-13.5,-2.6) -13.5,-1.3 ; -13.5,-3.9 13.5,-3.9 ; -13.5,-1.3 cw(c-13.5,0) -13.5,1.3 ; -13.5,-1.3 13.5,-1.3 ; -13.5,1.3 cw(c-13.5,2.6) -13.5,3.9 ; -13.5,1.3 13.5,1.3 ; -13.5,3.9 cw(c-13.5,5.2) -13.5,6.5 ; -13.5,3.9 13.5,3.9 ; -13.5,6.5 cw(c-13.5,7.8) -13.5,9.1 ; -13.5,6.5 13.5,6.5 ; -13.5,9.1 cw(c-13.5,10.4) -13.5,11.7 ; -13.5,9.1 13.5,9.1 ; -13.5,11.7 cw(c-13.5,13) -13.5,14.3 ; -13.5,11.7 13.5,11.7 ; -13.5,14.3 cw(c-13.5,15.6) -13.5,16.9 13.5,16.9 cw(c13.5,15.6) 13.5,14.3 ; -13.5,14.3 13.5,14.3 ; -13.5,14.3 13.5,14.3 ; 13.5,-14.3 ccw(c13.5,-13) 13.5,-11.7 ; 13.5,-11.7 ccw(c13.5,-10.4) 13.5,-9.1 ; 13.5,-9.1 ccw(c13.5,-7.8) 13.5,-6.5 ; 13.5,-6.5 ccw(c13.5,-5.2) 13.5,-3.9 ; 13.5,-3.9 ccw(c13.5,-2.6) 13.5,-1.3 ; 13.5,-1.3 ccw(c13.5,0) 13.5,1.3 ; 13.5,1.3 ccw(c13.5,2.6) 13.5,3.9 ; 13.5,3.9 ccw(c13.5,5.2) 13.5,6.5 ; 13.5,6.5 ccw(c13.5,7.8) 13.5,9.1 ; 13.5,9.1 ccw(c13.5,10.4) 13.5,11.7 ; 13.5,11.7 ccw(c13.5,13) 13.5,14.3 ; -27.25,-28.6 -27.25,-17.6 27.25,-17.6 27.25,-28.6 -27.25,-28.6
3D body "EDA-01905-V1-0_misc3.stp": height 43.4, standoff -3.86, extent -27.35,-28.6 27.35,28.6

## IND_EDA-02352-V1-0_MISC1 [mm] "see EDA-02352-V1-0_misc1"
height 44.5
pads (16):
  round 2.3 hole 1.6: 1(-22.86,15.24) 2(-22.86,10.16) 3(-22.86,5.08) 4(-22.86,0) 5(-22.86,-5.08) 6(-22.86,-10.16) 7(-22.86,-15.24) 8(22.86,-15.24) 9(22.86,-10.16) 10(22.86,-5.08) 11(22.86,0) 12(22.86,5.08) 13(22.86,10.16) 14(22.86,15.24)
  round 6.5 hole 3.5: 15(0,25.4) 16(0,-25.4)
Top Overlay:
  lines w0.2: -30.902,-4.772 cw(c-22,0) -30.902,4.772 ; -25.4,-15.54 -25.4,-16.9 -19.6,-16.9 -13.098,-4.772 ccw(c-22,0) -13.098,4.772 -19.6,16.9 ; -25.4,-14.94 -25.4,-13.7 -22.1,-13.7 -22.1,-11.7 -25.4,-11.7 -25.4,-10.46 ; -25.4,-9.86 -25.4,-8.62 -22.1,-8.62 -22.1,-6.62 -25.4,-6.62 -25.4,-5.38 ; -25.4,-4.78 -25.4,-3.54 -18.922,-3.54 ; -25.4,-0.3 -25.4,-1.54 -19.188,-1.54 ; -25.4,0.3 -25.4,1.54 -19.188,1.54 ; -25.4,4.78 -25.4,3.54 -18.922,3.54 ; -25.4,5.38 -25.4,6.62 -22.1,6.62 -22.1,8.62 -25.4,8.62 -25.4,9.86 ; -25.4,10.46 -25.4,11.7 -22.1,11.7 -22.1,13.7 -25.4,13.7 -25.4,14.94 ; -25.4,15.54 -25.4,16.9 -19.6,16.9 ; -24.381,-15.54 -32.75,-15.54 -32.75,-14.94 -24.381,-14.94 ; -24.381,-10.46 -32.75,-10.46 -32.75,-9.86 -24.381,-9.86 ; -24.381,-5.38 -32.75,-5.38 -32.75,-4.78 -24.381,-4.78 ; -24.381,-0.3 -32.75,-0.3 -32.75,0.3 -24.381,0.3 ; -24.381,4.78 -32.75,4.78 -32.75,5.38 -24.381,5.38 ; -24.381,9.86 -32.75,9.86 -32.75,10.46 -24.381,10.46 ; -24.381,14.94 -32.75,14.94 -32.75,15.54 -24.381,15.54 ; -21.6,16.9 cw(c-20.6,16.9) -19.6,16.9 ; -21.4,16.9 cw(c-20.6,16.9) -19.8,16.9 ; -21.2,16.9 cw(c-20.6,16.9) -20,16.9 ; -21,16.9 cw(c-20.6,16.9) -20.2,16.9 ; -20.8,16.9 cw(c-20.6,16.9) -20.4,16.9 ; -15.932,-10.804 cw(c0,0) -15.932,10.804 ; -10.896,-22.501 -2.423,-28.708 ccw(c0,-25.4) 2.423,-28.708 10.896,-22.501 ; -10.896,22.501 -2.423,28.708 cw(c0,25.4) 2.423,28.708 10.896,22.501 ; -3.491,-24.755 cw(c0,0) -18.178,-17.163 cw(c-17.087,-16.133) -18.409,-15.425 -12.698,-4.772 ccw(c-21.6,0) -12.698,4.772 -18.409,15.425 cw(c-17.087,16.133) -18.178,17.163 cw(c0,0) -3.491,24.755 ; -1.3,-22.097 -1.3,22.097 ; -1.3,-2.366 cw(c0,0) -1.3,2.366 ; 1.3,-22.097 1.3,22.097 ; 1.3,-2.366 ccw(c0,0) 1.3,2.366 ; 3.491,-24.755 ccw(c0,0) 18.178,-17.163 ccw(c17.087,-16.133) 18.409,-15.425 12.698,-4.772 cw(c21.6,0) 12.698,4.772 18.409,15.425 ccw(c17.087,16.133) 18.178,17.163 ccw(c0,0) 3.491,24.755 ; 15.932,-10.804 ccw(c0,0) 15.932,10.804 ; 18.922,-3.54 25.4,-3.54 25.4,-4.78 ; 18.922,3.54 25.4,3.54 25.4,4.78 ; 19.188,-1.54 25.4,-1.54 25.4,-0.3 ; 19.188,1.54 25.4,1.54 25.4,0.3 ; 24.381,-15.54 32.75,-15.54 32.75,-14.94 24.381,-14.94 ; 24.381,-10.46 32.75,-10.46 32.75,-9.86 24.381,-9.86 ; 24.381,-5.38 32.75,-5.38 32.75,-4.78 24.381,-4.78 ; 24.381,-0.3 32.75,-0.3 32.75,0.3 24.381,0.3 ; 24.381,4.78 32.75,4.78 32.75,5.38 24.381,5.38 ; 24.381,9.86 32.75,9.86 32.75,10.46 24.381,10.46 ; 24.381,14.94 32.75,14.94 32.75,15.54 24.381,15.54 ; 25.4,-15.54 25.4,-16.9 19.6,-16.9 13.098,-4.772 cw(c22,0) 13.098,4.772 19.6,16.9 25.4,16.9 25.4,15.54 ; 25.4,-14.94 25.4,-13.7 22.1,-13.7 22.1,-11.7 25.4,-11.7 25.4,-10.46 ; 25.4,-9.86 25.4,-8.62 22.1,-8.62 22.1,-6.62 25.4,-6.62 25.4,-5.38 ; 25.4,5.38 25.4,6.62 22.1,6.62 22.1,8.62 25.4,8.62 25.4,9.86 ; 25.4,10.46 25.4,11.7 22.1,11.7 22.1,13.7 25.4,13.7 25.4,14.94 ; 30.902,-4.772 ccw(c22,0) 30.902,4.772
  text "1" at -23.238,17.75 h1.5
  text "7" at -23.478,-19.09 h1.5
  text "8" at 22.242,-19.09 h1.5
  text "14" at 22.482,17.75 h1.5
Mechanical 8:
  lines w0.1: -23.36,-15.24 -22.86,-15.24 ; -23.36,-10.16 -22.86,-10.16 ; -23.36,-5.08 -22.86,-5.08 ; -23.36,0 -22.86,0 ; -23.36,5.08 -22.86,5.08 ; -23.36,10.16 -22.86,10.16 ; -23.36,15.24 -22.86,15.24 ; -22.86,-15.74 -22.86,-15.24 ; -22.86,-14.74 -22.86,-15.24 ; -22.86,-10.66 -22.86,-10.16 ; -22.86,-9.66 -22.86,-10.16 ; -22.86,-5.58 -22.86,-5.08 ; -22.86,-4.58 -22.86,-5.08 ; -22.86,-0.5 -22.86,0 ; -22.86,0.5 -22.86,0 ; -22.86,4.58 -22.86,5.08 ; -22.86,5.58 -22.86,5.08 ; -22.86,9.66 -22.86,10.16 ; -22.86,10.66 -22.86,10.16 ; -22.86,14.74 -22.86,15.24 ; -22.86,15.74 -22.86,15.24 ; -22.36,-15.24 -22.86,-15.24 ; -22.36,-10.16 -22.86,-10.16 ; -22.36,-5.08 -22.86,-5.08 ; -22.36,0 -22.86,0 ; -22.36,5.08 -22.86,5.08 ; -22.36,10.16 -22.86,10.16 ; -22.36,15.24 -22.86,15.24 ; -0.5,-25.4 0,-25.4 ; -0.5,0 0,0 ; 0,-25.9 0,-25.4 ; 0,-24.9 0,-25.4 ; 0,-0.5 0,0 ; 0,0.5 0,0 ; 0.5,-25.4 0,-25.4 ; 0.5,0 0,0 ; 0,25.4 -0.5,25.4 0,25.4 ; 0,25.4 0,25.9 0,25.4 ; 0,25.4 0.5,25.4 0,25.4 ; 0,25.4 0,24.9 0,25.4 ; 22.86,-15.24 22.36,-15.24 22.86,-15.24 ; 22.86,-15.24 22.86,-14.74 22.86,-15.24 ; 22.86,-15.24 23.36,-15.24 22.86,-15.24 ; 22.86,-15.24 22.86,-15.74 22.86,-15.24 ; 22.86,-10.16 22.36,-10.16 22.86,-10.16 ; 22.86,-10.16 22.86,-9.66 22.86,-10.16 ; 22.86,-10.16 23.36,-10.16 22.86,-10.16 ; 22.86,-10.16 22.86,-10.66 22.86,-10.16 ; 22.86,-5.08 22.36,-5.08 22.86,-5.08 ; 22.86,-5.08 22.86,-4.58 22.86,-5.08 ; 22.86,-5.08 23.36,-5.08 22.86,-5.08 ; 22.86,-5.08 22.86,-5.58 22.86,-5.08 ; 22.86,0 22.36,0 22.86,0 ; 22.86,0 22.86,0.5 22.86,0 ; 22.86,0 23.36,0 22.86,0 ; 22.86,0 22.86,-0.5 22.86,0 ; 22.86,5.08 22.36,5.08 22.86,5.08 ; 22.86,5.08 22.86,5.58 22.86,5.08 ; 22.86,5.08 23.36,5.08 22.86,5.08 ; 22.86,5.08 22.86,4.58 22.86,5.08 ; 22.86,10.16 22.36,10.16 22.86,10.16 ; 22.86,10.16 22.86,10.66 22.86,10.16 ; 22.86,10.16 23.36,10.16 22.86,10.16 ; 22.86,10.16 22.86,9.66 22.86,10.16 ; 22.86,15.24 22.36,15.24 22.86,15.24 ; 22.86,15.24 22.86,15.74 22.86,15.24 ; 22.86,15.24 23.36,15.24 22.86,15.24 ; 22.86,15.24 22.86,14.74 22.86,15.24
Mechanical 14:
  drawing of 159 lines, arcs and shapes, not listed
  text "1" at -23.238,17.75 h1.5
  text "7" at -23.478,-19.09 h1.5
  text "8" at 22.242,-19.09 h1.5
  text "14" at 22.482,17.75 h1.5
3D body "IND_EPCOS_PM 50-39_Part1.stp": height 44.5, standoff -8.5, extent -32.75,-26.7 32.75,27.1
3D body "IND_EPCOS_PM 50-39_Part2.stp": height -1.8, standoff -5.3, extent -18.572,-29.5 18.572,29.5

## MTGP720H320V6P [mm]
pads (1):
  round 7.2 hole 3.25: 1(0,0)
via -2.2,-1.35 diameter 1 hole 0.5
via -2.2,1.375 diameter 1 hole 0.5
via 0,2.525 diameter 1 hole 0.5
via 2.2,1.35 diameter 1 hole 0.5
via 0,-2.625 diameter 1 hole 0.5
via 2.2,-1.35 diameter 1 hole 0.5
Mechanical 8:
  circle w0.1: c0,0 r2.6
  circle w0.1: c0,0 r3.75
  lines w0.1: -2.657,1.625 -2.224,1.375 ; -2.632,-1.6 -2.199,-1.35 ; -2.474,0.942 -2.224,1.375 ; -2.449,-0.917 -2.199,-1.35 ; -1.974,1.808 -2.224,1.375 ; -1.949,-1.783 -2.199,-1.35 ; -1.791,1.125 -2.224,1.375 ; -1.766,-1.1 -2.199,-1.35 ; -0.5,-2.625 0,-2.625 ; -0.5,0 0,0 ; -0.5,2.525 0,2.525 ; 0,-3.125 0,-2.625 ; 0,-2.125 0,-2.625 ; 0,-0.5 0,0 ; 0,0.5 0,0 ; 0,2.025 0,2.525 ; 0,3.025 0,2.525 ; 0.5,-2.625 0,-2.625 ; 0.5,0 0,0 ; 0.5,2.525 0,2.525 ; 1.766,-1.1 2.199,-1.35 ; 1.766,1.1 2.199,1.35 ; 1.949,-1.783 2.199,-1.35 ; 1.949,1.783 2.199,1.35 ; 2.449,-0.917 2.199,-1.35 ; 2.449,0.917 2.199,1.35 ; 2.632,-1.6 2.199,-1.35 ; 2.632,1.6 2.199,1.35
Mechanical 14:
  circle w0.1: c0,0 r3.75
Mechanical 15:
  circle w0.05: c0,0 r3.85
3D body "mtgp720h320v6p.stp": height 0.1, standoff -1.75, extent -3.627,-3.627 3.628,3.628

## PB [mm]
Top Overlay:
  circle w0.5: c-0.031,0.013 r2.5
  lines w0.5: -1.737,1.719 1.675,-1.693
  text "Pb" at -1.536,-0.948 h3.05
3D body "pb.stp": height 0.02, standoff 0, extent -2.725,-2.725 2.725,2.725

## PE2824-I [mm]
height 38.1
pads (6):
  rect 3x3 hole 1.3: 1(-10.16,10.16)
  round 3 hole 1.3: 5(-10.16,-10.16) 6(10.16,-10.16) 7(10.16,-5.08) 9(10.26,5.08) 10(10.16,10.16)
Top Overlay:
  lines w0.254: -14,-15.8 -14,15.8 14,15.8 14,-15.8 -14,-15.8
Keep-Out Layer:
  circle w0.127: c0,11.8 r1.3
  circle w0.127: c0,-11.8 r1.3
Mechanical 1:
  circle w0.127: c0,-11.8 r1.3
  circle w0.127: c0,11.8 r1.3
Mechanical 15:
  lines w0.127: -14.2,-16 14.2,-16 14.2,16 -14.2,16 -14.2,-16
3D body "ei10x15.stp": height 29.3, standoff -3, extent -15.095,-17.4 14.895,17.8